# Altium footprint library HW_SSB1.PcbLib: 48 footprints (part 1 of 3)
Each footprint in its own frame and in the unit in brackets; x right, y up, seen from the top. Pads: shape width x height; smd on the part's side, far side on the other; paste and mask are expansions set on the pad; w line width, h text height; cw(c..) or ccw(c..) is an arc to the next point about the centre after c.
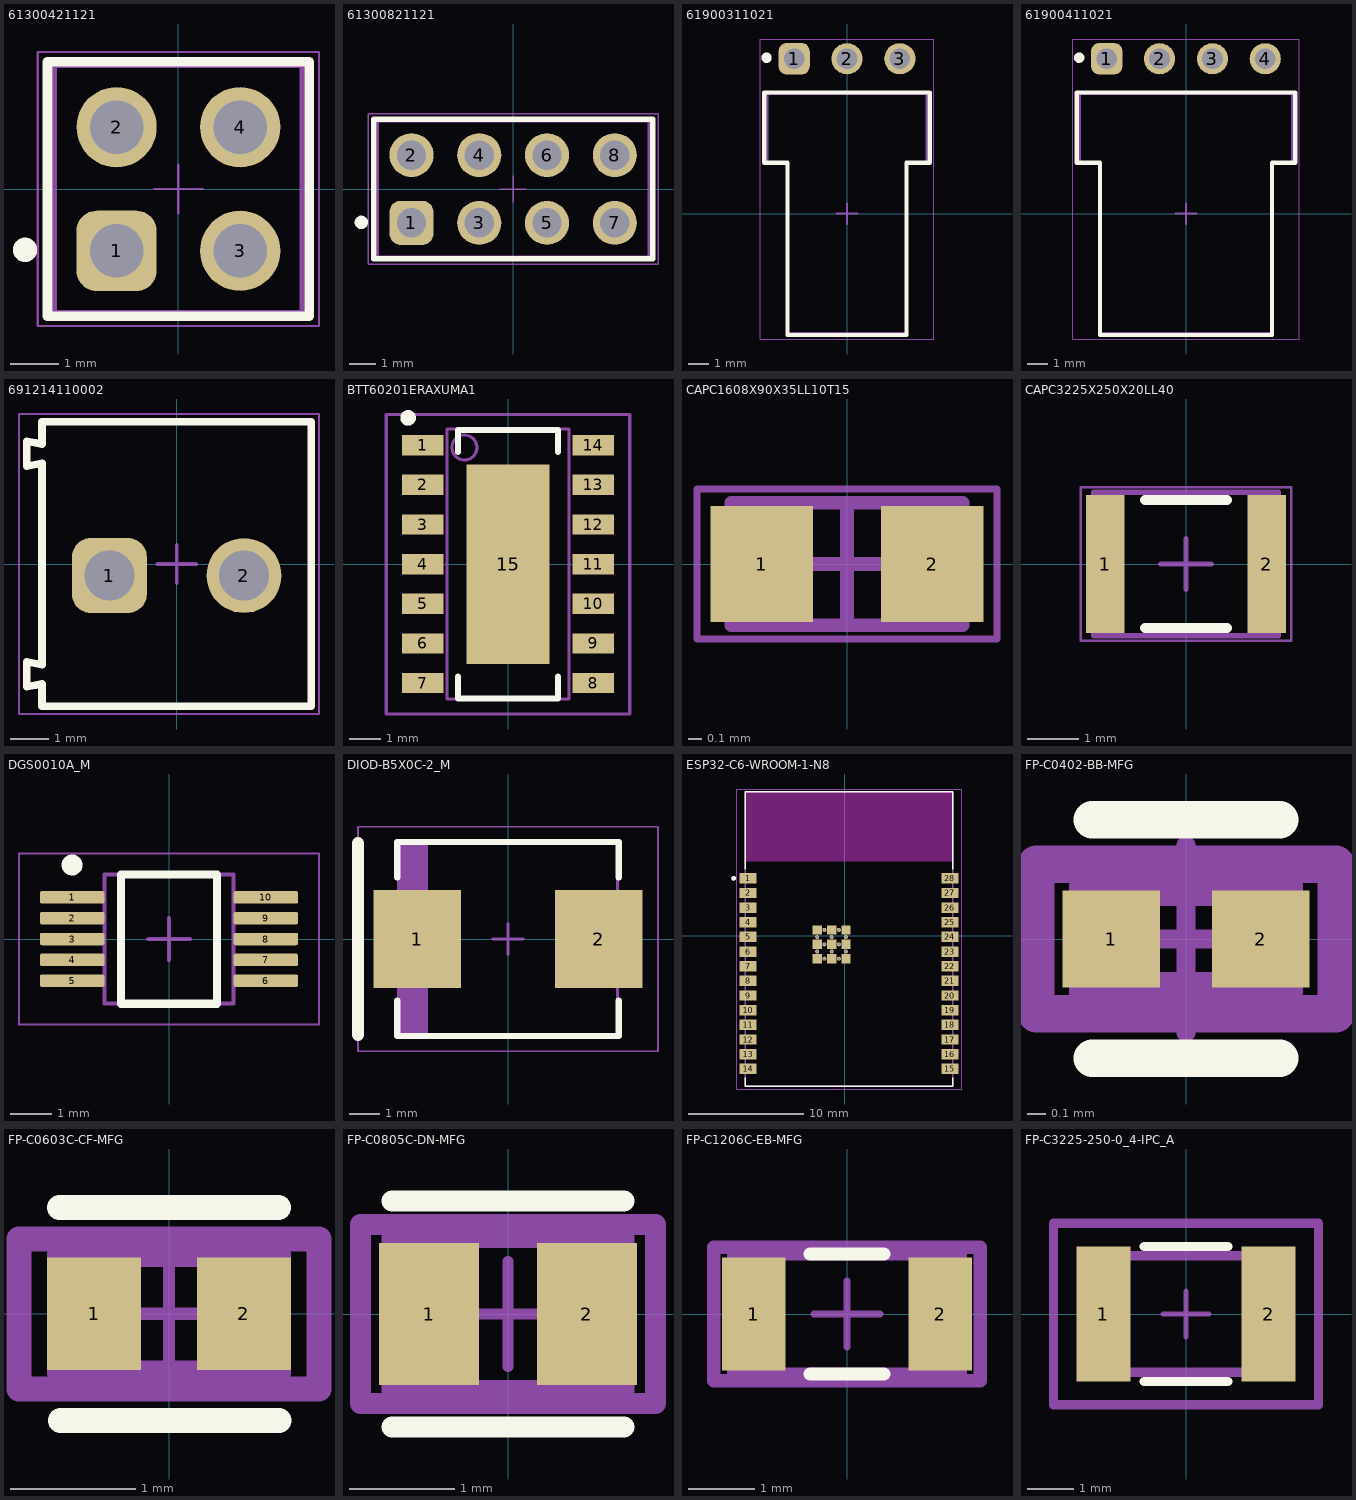
[diagram p0: the footprints below, top view; thin cyan lines are the x and y axes]

## 61300421121 [mm]
pads (4):
  rrect50% 1.65x1.65 hole 1.1: 1(-1.27,-1.27)
  round 1.65 hole 1.1: 2(-1.27,1.27) 3(1.27,-1.27) 4(1.27,1.27)
Top Overlay:
  circle w0.25: c-3.15,-1.25 r0.125
  lines w0.2: -2.69,-2.615 2.69,-2.615 2.69,2.615 -2.69,2.615 -2.69,-2.615
Top Component Outline:
  lines w0.1: -2.54,-2.54 2.54,-2.54 2.54,2.54 -2.54,2.54 -2.54,-2.54
Top Courtyard:
  lines w0.05: -2.89,-2.815 -2.89,2.815 2.89,2.815 2.89,-2.815 -2.89,-2.815
Top Component Center:
  lines w0.05: -0.5,0 0.5,0 ; 0,-0.5 0,0.5
Top Designator:
  text ".Designator" at -7.498,-0.5 h1.5
3D body "61300421121.stp": height 8.59, standoff -2.95, extent -2.54,-2.54 2.54,2.54

## 61300821121 [mm]
pads (8):
  rrect50% 1.65x1.65 hole 1.1: 1(-3.81,-1.27)
  round 1.65 hole 1.1: 2(-3.81,1.27) 3(-1.27,-1.27) 4(-1.27,1.27) 5(1.27,-1.27) 6(1.27,1.27) 7(3.81,-1.27) 8(3.81,1.27)
Top Overlay:
  circle w0.25: c-5.69,-1.25 r0.125
  lines w0.2: -5.23,-2.615 5.23,-2.615 5.23,2.615 -5.23,2.615 -5.23,-2.615
Top Component Outline:
  lines w0.1: -5.08,-2.54 5.08,-2.54 5.08,2.54 -5.08,2.54 -5.08,-2.54
Top Courtyard:
  lines w0.05: -5.43,-2.815 -5.43,2.815 5.43,2.815 5.43,-2.815 -5.43,-2.815
Top Component Center:
  lines w0.05: -0.5,0 0.5,0 ; 0,-0.5 0,0.5
Top Designator:
  text ".Designator" at -7.498,-0.5 h1.5
3D body "61300821121.stp": height 8.59, standoff -2.95, extent -5.08,-2.54 5.08,2.54

## 61900311021 [mm]
pads (3):
  rrect50% 1.5x1.5 hole 1: 1(-2.54,7.45)
  round 1.5 hole 1: 2(0,7.45) 3(2.54,7.45)
Top Overlay:
  circle w0.25: c-3.87,7.5 r0.125
  lines w0.2: -3.98,2.45 -2.86,2.45 -2.86,-5.825 2.86,-5.825 2.86,2.45 3.98,2.45 3.98,5.825 -3.98,5.825 -3.98,2.45
Top Assembly:
  lines w0.1: -3.83,2.45 -3.83,5.75 3.83,5.75 3.83,2.45 2.86,2.45 2.86,-5.75 -2.86,-5.75 -2.86,2.45 -3.83,2.45
Top Courtyard:
  lines w0.05: -4.18,-6.025 4.18,-6.025 4.18,8.4 -4.18,8.4 -4.18,-6.025
Top Component Center:
  lines w0.1: -0.5,0 0.5,0 ; 0,-0.5 0,0.5
Top Designator:
  text ".Designator" at -3.647,-0.357 h1
3D body "61900311021.stp": height 5.83, standoff -3.37, extent -3.81,-5.75 3.81,7.77

## 61900411021 [mm]
pads (4):
  rrect50% 1.5x1.5 hole 1: 1(-3.81,7.45)
  round 1.5 hole 1: 2(-1.27,7.45) 3(1.27,7.45) 4(3.81,7.45)
Top Overlay:
  circle w0.25: c-5.14,7.5 r0.125
  lines w0.2: -5.25,2.45 -4.13,2.45 -4.13,-5.825 4.13,-5.825 4.13,2.45 5.25,2.45 5.25,5.825 -5.25,5.825 -5.25,2.45
Top Assembly:
  lines w0.1: -5.1,2.45 -5.1,5.75 5.1,5.75 5.1,2.45 4.13,2.45 4.13,-5.75 -4.13,-5.75 -4.13,2.45 -5.1,2.45
Top Courtyard:
  lines w0.05: -5.45,-6.025 5.45,-6.025 5.45,8.4 -5.45,8.4 -5.45,-6.025
Top Component Center:
  lines w0.1: -0.5,0 0.5,0 ; 0,-0.5 0,0.5
Top Designator:
  text ".Designator" at -3.647,-0.357 h1
3D body "61900411021.stp": height 5.83, standoff -3.37, extent -5.08,-5.75 5.08,7.77

## 691214110002 [mm]
pads (2):
  rrect50% 1.95x1.95 hole 1.3: 1(-1.75,-0.3)
  round 1.95 hole 1.3: 2(1.75,-0.3)
Top Overlay:
  lines w0.2: -3.9,-3.195 -3.5,-3.12 -3.5,-3.7 3.5,-3.7 3.5,3.7 -3.5,3.7 -3.5,3.12 -3.9,3.195 -3.9,2.545 -3.5,2.62 -3.5,-2.62 -3.9,-2.545 -3.9,-3.195
Top Assembly:
  lines w0.1: -3.9,-3.195 -3.9,-2.545 -3.5,-2.62 -3.5,2.62 -3.9,2.545 -3.9,3.195 -3.5,3.12 -3.5,3.7 3.5,3.7 3.5,-3.7 -3.5,-3.7 -3.5,-3.12 -3.9,-3.195
Top 3D Body:
  lines w0.1: -3.9,-3.195 -3.5,-3.12 -3.5,-3.7 3.5,-3.7 3.5,3.7 -3.5,3.7 -3.5,3.12 -3.9,3.195 -3.9,2.545 -3.5,2.62 -3.5,-2.62 -3.9,-2.545 -3.9,-3.195
Top Courtyard:
  lines w0.05: -4.1,-3.9 3.7,-3.9 3.7,3.9 -4.1,3.9 -4.1,-3.9
Top Component Center:
  lines w0.1: -0.5,0 0.5,0 ; 0,-0.5 0,0.5
Top Designator:
  text ".Designator" at -3.647,-0.357 h1
3D body "691214110002.stp": height 8.55, standoff -3.65, extent -3.95,-3.7 3.5,3.7

## BTT60201ERAXUMA1 [mm]
pads (15):
  rect 1.34x0.65 smd paste+0 mask+0.102: 1(-2.73,3.81) 2(-2.73,2.54) 3(-2.73,1.27) 4(-2.73,0) 5(-2.73,-1.27) 6(-2.73,-2.54) 7(-2.73,-3.81) 8(2.73,-3.81) 9(2.73,-2.54) 10(2.73,-1.27) 11(2.73,0) 12(2.73,1.27) 13(2.73,2.54) 14(2.73,3.81)
  rect 2.65x6.4 smd paste-4 mask+0.102: 15(0,0)
Top Overlay:
  circle w0.25: c-3.2,4.685 r0.125
  lines w0.2: -1.6,-3.6 -1.6,-4.3 1.6,-4.3 1.6,-3.6 ; -1.6,3.6 -1.6,4.3 1.6,4.3 1.6,3.6
Top Paste:
  region: 1.225,-3.1 -1.225,-3.1 -1.225,-0.15 1.225,-0.15
  region: 1.225,0.15 -1.225,0.15 -1.225,3.1 1.225,3.1
Top 3D Body:
  circle w0.1: c-1.395,3.735 r0.4
  lines w0.1: -0.5,0 0.5,0 ; 0,-0.5 0,0.5 ; -1.95,-4.325 -1.95,4.325 1.95,4.325 1.95,-4.325 -1.95,-4.325
Top Courtyard:
  lines w0.1: -3.9,-4.8 3.9,-4.8 3.9,4.8 -3.9,4.8 -3.9,-4.8
3D body "step_temp.STEP": height 1.15, standoff 0, extent -3,-4.325 3,4.325

## CAPC1608X90X35LL10T15 [mm]
pads (2):
  rect 0.75x0.85 smd: 1(-0.625,0) 2(0.625,0)
Top 3D Body:
  lines w0.1: -0.85,-0.45 -0.85,0.45 0.85,0.45 0.85,-0.45 -0.85,-0.45
Top Courtyard:
  lines w0.05: -1.1,-0.55 -1.1,0.55 1.1,0.55 1.1,-0.55 -1.1,-0.55
  lines w0.1: -0.45,0 0.45,0 ; 0,-0.45 0,0.45
3D body "CAPC1608X09L.step": height 0.9, standoff 0, extent -0.85,-0.45 0.85,0.45

## CAPC3225X250X20LL40 [mm]
pads (2):
  rect 0.75x2.7 smd: 1(-1.575,0) 2(1.575,0)
Top Overlay:
  lines w0.2: -0.8,-1.25 0.8,-1.25 ; -0.8,1.25 0.8,1.25
Top 3D Body:
  lines w0.1: -1.8,-1.4 1.8,-1.4 1.8,1.4 -1.8,1.4 -1.8,-1.4
Top Courtyard:
  lines w0.05: -2.05,-1.5 2.05,-1.5 2.05,1.5 -2.05,1.5 -2.05,-1.5
  lines w0.1: -0.5,0 0.5,0 ; 0,-0.5 0,0.5
3D body "CAPC3225X25L.step": height 2.5, standoff 0, extent -1.8,-1.4 1.8,1.4

## DGS0010A_M [mm]
pads (10):
  rrect33% 1.55x0.3 smd: 1(-2.325,1) 2(-2.325,0.5) 3(-2.325,0) 4(-2.325,-0.5) 5(-2.325,-1) 6(2.325,-1) 7(2.325,-0.5) 8(2.325,0) 9(2.325,0.5) 10(2.325,1)
Top Overlay:
  circle w0.25: c-2.325,1.775 r0.125
  lines w0.2: -1.15,-1.55 1.15,-1.55 1.15,1.55 -1.15,1.55 -1.15,-1.55
Mechanical 1:
  text ".Designator" at -1.397,-0.254 h0.7
Top 3D Body:
  lines w0.1: -1.55,-1.55 1.55,-1.55 1.55,1.55 -1.55,1.55 -1.55,-1.55
Top Courtyard:
  lines w0.05: -3.6,-2.05 3.6,-2.05 3.6,2.05 -3.6,2.05 -3.6,-2.05
  lines w0.1: -0.5,0 0.5,0 ; 0,-0.5 0,0.5
3D body "DGS0010AakaMUB10A.stp": height 0.94, standoff -0.02, extent -2.451,-1.499 2.451,1.499

## DIOD-B5X0C-2_M [mm]
pads (2):
  rect 2.85x3.2 smd: 1(-2.95,0) 2(2.95,0)
Top Overlay:
  lines w0.2: -3.6,-2 -3.6,-3.15 3.6,-3.15 3.6,-2 ; -3.6,2 -3.6,3.15 3.6,3.15 3.6,2
  lines w0.4: -4.875,-3.11 -4.875,3.11
Top 3D Body:
  rectangle: -3.555,-3.11 -2.598,3.11
  lines w0.1: -3.555,-3.11 -3.555,3.11 3.555,3.11 3.555,-3.11 -3.555,-3.11
Top Courtyard:
  lines w0.05: -4.875,-3.65 -4.875,3.65 4.875,3.65 4.875,-3.65 -4.875,-3.65
  lines w0.1: -0.5,0 0.5,0 ; 0,-0.5 0,0.5
3D body: height 2.62, standoff 0, extent -3.555,-3.11 3.555,3.11
3D body: height 2.63, standoff 2.62, extent -3.3,-3.11 -3,3.11

## ESP32-C6-WROOM-1-N8 [mm]
pads (49):
  rect 1.5x0.9 smd: 1(-8.368,4.968) 2(-8.368,3.698) 3(-8.368,2.428) 4(-8.368,1.158) 5(-8.368,-0.112) 6(-8.368,-1.382) 7(-8.368,-2.652) 8(-8.368,-3.922) 9(-8.368,-5.192) 10(-8.368,-6.462) 11(-8.368,-7.732) 12(-8.368,-9.002) 13(-8.368,-10.272) 14(-8.368,-11.542) 15(9.132,-11.542) 16(9.132,-10.272) 17(9.132,-9.002) 18(9.132,-7.732) 19(9.132,-6.462) 20(9.132,-5.192) 21(9.132,-3.922) 22(9.132,-2.652) 23(9.132,-1.382) 24(9.132,-0.112) 25(9.132,1.158) 26(9.132,2.428) 27(9.132,3.698) 28(9.132,4.968)
  rect 0.8x0.8 smd: 29_1(-2.373,0.498) 29_2(-1.123,0.498) 29_3(0.127,0.498) 29_4(-2.373,-0.752) 29_5(-1.123,-0.752) 29_6(0.127,-0.752) 29_7(-2.373,-2.002) 29_8(-1.123,-2.002) 29_9(0.127,-2.002)
  round 0.35 hole 0.25 mask+0: 30_1(-1.748,0.498) 30_2(-0.498,0.498) 30_3(-2.373,-0.127) 30_4(-1.123,-0.127) 30_5(0.127,-0.127) 30_6(-1.748,-0.752) 30_7(-0.498,-0.752) 30_8(-2.373,-1.377) 30_9(-1.123,-1.377) 30_10(0.127,-1.377) 30_11(-1.748,-2.002) 30_12(-0.498,-2.002)
Top Overlay:
  circle w0.2: c-9.618,4.958 r0.1
  lines w0.127: -8.618,-12.312 -8.618,-13.042 9.382,-13.042 9.382,-12.312 ; -8.618,5.738 -8.618,12.458 9.382,12.458 9.382,5.738
Keep-Out Layer:
  region: 9.382,6.458 -8.618,6.458 -8.618,12.458 9.382,12.458
Top 3D Body:
  circle w0.2: c-9.618,4.958 r0.1
  lines w0.127: -8.618,-13.042 -8.618,12.458 9.382,12.458 9.382,-13.042 -8.618,-13.042
Top Courtyard:
  lines w0.05: -9.368,-13.292 10.132,-13.292 10.132,12.708 -9.368,12.708 -9.368,-13.292
3D body "step_temp.STEP": height 3.25, standoff 0, extent -8.618,-13.042 9.382,12.458

## FP-C0402-BB-MFG [mm]
pads (2):
  rect 0.52x0.52 smd paste+0 mask+0: 1(-0.4,0) 2(0.4,0)
Top Overlay:
  lines w0.2: -0.5,-0.635 0.5,-0.635 ; -0.5,0.635 0.5,0.635
Top Assembly:
  lines w0.2: -0.8,-0.4 0.8,-0.4 0.8,0.4 -0.8,0.4 -0.8,-0.4
  text ".Designator" at 0,0.188 h1
Top 3D Body:
  lines w0.2: -0.525,-0.275 0.525,-0.275 0.525,0.275 -0.525,0.275 -0.525,-0.275
Top Courtyard:
  lines w0.2: -0.8,-0.4 0.8,-0.4 0.8,0.4 -0.8,0.4 -0.8,-0.4
Top Component Center:
  lines w0.1: -0.5,0 0.5,0 ; 0,-0.5 0,0.5
3D body "Cap_Kemet_C0402C562J5RACTU_eec.STEP": height 0.25, standoff 0, extent -0.8,-0.4 0.8,0.4

## FP-C0603C-CF-MFG [mm]
pads (2):
  rect 0.75x0.9 smd paste+0 mask+0: 1(-0.6,0) 2(0.6,0)
Top Overlay:
  lines w0.2: -0.875,0.85 0.875,0.85 ; -0.87,-0.853 0.88,-0.853
Top Assembly:
  lines w0.2: -1.2,-0.6 1.2,-0.6 1.2,0.6 -1.2,0.6 -1.2,-0.6
  text ".Designator" at 0,0.188 h1
Top 3D Body:
  lines w0.2: -0.875,-0.475 0.875,-0.475 0.875,0.475 -0.875,0.475 -0.875,-0.475
Top Courtyard:
  lines w0.2: -1.2,-0.6 1.2,-0.6 1.2,0.6 -1.2,0.6 -1.2,-0.6
Top Component Center:
  lines w0.1: -0.5,0 0.5,0 ; 0,-0.5 0,0.5
3D body "Cap_KEMET_C0603C272M5JACTU_eec.STEP": height 0.25, standoff 0, extent -1.2,-0.6 1.2,0.6

## FP-C0805C-DN-MFG [mm]
pads (2):
  rect 0.95x1.35 smd paste+0 mask+0: 1(-0.75,0) 2(0.75,0)
Top Overlay:
  lines w0.2: -1.1,-1.075 1.1,-1.075 ; -1.1,1.075 1.1,1.075
Top Assembly:
  lines w0.2: -1.4,-0.85 1.4,-0.85 1.4,0.85 -1.4,0.85 -1.4,-0.85
  text ".Designator" at 0,0.188 h1
Top 3D Body:
  lines w0.2: -1.1,-0.725 1.1,-0.725 1.1,0.725 -1.1,0.725 -1.1,-0.725
Top Courtyard:
  lines w0.2: -1.4,-0.85 1.4,-0.85 1.4,0.85 -1.4,0.85 -1.4,-0.85
Top Component Center:
  lines w0.1: -0.5,0 0.5,0 ; 0,-0.5 0,0.5
3D body "Cap_KEMET_C0805C472J3HAC_eec.STEP": height 0.25, standoff 0, extent -1.4,-0.85 1.4,0.85

## FP-C1206C-EB-MFG [mm]
pads (2):
  rect 0.95x1.7 smd paste+0 mask+0: 1(-1.4,0) 2(1.4,0)
Top Overlay:
  lines w0.2: -0.55,-0.9 0.55,-0.9 ; -0.55,0.9 0.55,0.9
Top Assembly:
  lines w0.2: -2,-1 2,-1 2,1 -2,1 -2,-1
  text ".Designator" at 0,0.188 h1
Top 3D Body:
  lines w0.2: -1.7,-0.9 1.7,-0.9 1.7,0.9 -1.7,0.9 -1.7,-0.9
Top Courtyard:
  lines w0.2: -2,-1 2,-1 2,1 -2,1 -2,-1
Top Component Center:
  lines w0.1: -0.5,0 0.5,0 ; 0,-0.5 0,0.5
3D body "Cap_KEMET_C1206C472K4RACTU_eec.STEP": height 0.25, standoff 0, extent -2,-1 2,1

## FP-C3225-250-0_4-IPC_A [mm]
pads (2):
  rect 1.153x2.904 smd paste+0 mask+0: 1(-1.775,0) 2(1.775,0)
Top Overlay:
  lines w0.2: -0.898,-1.452 0.898,-1.452 ; -0.898,1.452 0.898,1.452
Top Assembly:
  lines w0.2: -2.852,-1.952 2.852,-1.952 2.852,1.952 -2.852,1.952 -2.852,-1.952
  text ".Designator" at 0,0.188 h1
Top 3D Body:
  lines w0.2: -1.6,-1.25 1.6,-1.25 1.6,1.25 -1.6,1.25 -1.6,-1.25
Top Courtyard:
  lines w0.2: -2.852,-1.952 2.852,-1.952 2.852,1.952 -2.852,1.952 -2.852,-1.952
Top Component Center:
  lines w0.1: -0.5,0 0.5,0 ; 0,-0.5 0,0.5
3D body "Cap_TDK_C3225X7R1H106M250AC_eec.STEP": height 0.25, standoff 0, extent -2.852,-1.952 2.852,1.952